# Altium footprint library SMotlaq-PCB_lib.PcbLib: 186 footprints (part 6 of 12)
Each footprint in its own frame and in the unit in brackets; x right, y up, seen from the top. Pads: shape width x height; smd on the part's side, far side on the other; paste and mask are expansions set on the pad; w line width, h text height; cw(c..) or ccw(c..) is an arc to the next point about the centre after c.
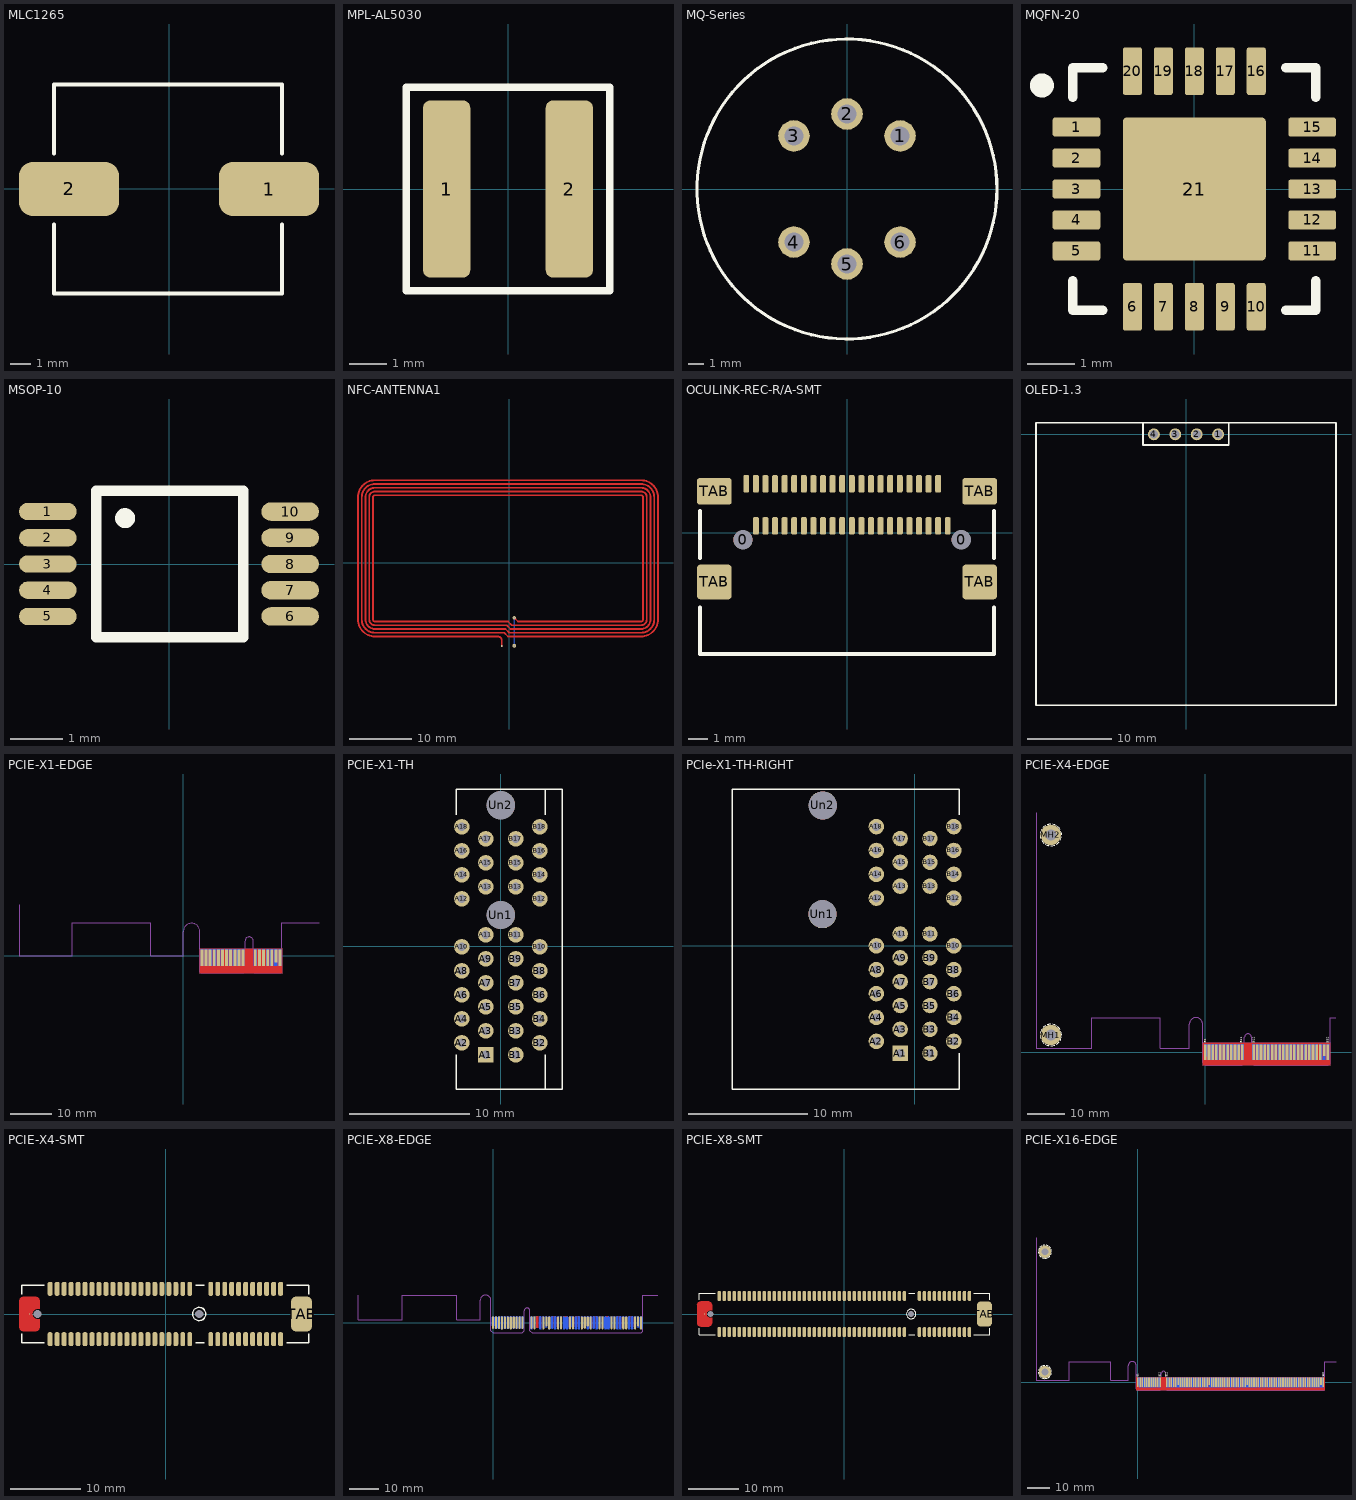
[diagram p5: the footprints below, top view; thin cyan lines are the x and y axes]

## MLC1265 [mm]
pads (2):
  rrect50% 5x2.7 smd mask+0.1: 1(5,0) 2(-5,0)
Top Overlay:
  lines w0.2: -5.75,-1.775 -5.75,-5.225 5.65,-5.225 5.65,-1.775 ; -5.75,1.775 -5.75,5.225 5.65,5.225 5.65,1.775
3D body "Coilcraft-MLC1265.step": height 6.4, standoff -0.01, extent -5.75,-5.275 5.65,5.225

## MPL-AL5030 [mm]
height 2.9
pads (2):
  rrect30% 1.25x4.7 smd mask+0.1: 1(-1.625,0) 2(1.625,0)
Top Overlay:
  lines w0.2: -2.7,-2.7 2.7,-2.7 2.7,2.7 -2.7,2.7 -2.7,-2.7
3D body "MPL-AL5030-1R5.stp": height 2.1, standoff 0, extent -2.65,-2.75 2.65,2.75

## MQ-Series [mm]
pads (6):
  round 2 hole 1.2: 1(3.359,3.359) 2(0,4.75) 3(-3.359,3.359) 4(-3.359,-3.359) 5(0,-4.75) 6(3.359,-3.359)
Top Overlay:
  circle w0.2: c0,0 r9.5
3D body "User Library-MQ-5.step": height 17.06, standoff -6, extent -9.5,-9.5 9.5,9.5

## MQFN-20 [mm]
pads (21):
  rrect25% 1x0.4 smd: 1(-2.475,1.3) 2(-2.475,0.65) 3(-2.475,0) 4(-2.475,-0.65) 5(-2.475,-1.3) 11(2.475,-1.3) 12(2.475,-0.65) 13(2.475,0) 14(2.475,0.65) 15(2.475,1.3)
  rrect25% 0.4x1 smd: 6(-1.3,-2.475) 7(-0.65,-2.475) 8(0,-2.475) 9(0.65,-2.475) 10(1.3,-2.475) 16(1.3,2.475) 17(0.65,2.475) 18(0,2.475) 19(-0.65,2.475) 20(-1.3,2.475)
  rrect5% 3x3 smd: 21(0,0)
Top Overlay:
  circle w0.254: c-3.2,2.175 r0.125
  lines w0.2: -2.55,-1.925 -2.55,-2.55 -1.925,-2.55 ; -2.55,1.925 -2.55,2.55 -1.925,2.55 ; 1.925,-2.55 2.55,-2.55 2.55,-1.925 ; 1.925,2.55 2.55,2.55 2.55,1.925
3D body "MCP96RL00-E_MX.stp": height 1, standoff 0, extent -2.55,-2.55 2.55,2.55

## MSOP-10 [mm]
pads (10):
  rrect100% 1.1x0.33 smd: 1(-2.312,1) 2(-2.312,0.5) 3(-2.312,0) 4(-2.312,-0.5) 5(-2.312,-1)
  rrect100% 1.1x0.35 smd: 6(2.312,-1) 7(2.312,-0.5) 8(2.312,0) 9(2.312,0.5) 10(2.312,1)
Top Overlay:
  circle w0.2: c-0.837,0.875 r0.09
  lines w0.2: -1.388,-1.4 1.412,-1.4 1.412,1.4 -1.388,1.4 -1.388,-1.4
3D body "User Library-MSOP-10-2.STEP": height 1.25, standoff 0, extent -2.437,-1.5 2.463,1.5

## NFC-ANTENNA1 [mm]
pads (2):
  round 0.6 hole 0.3 mask+0.102: 1(0.817,-13.268)
  round 0.3 smd mask+0.102: 2(-1.183,-13.268)
via 0.817,-8.768 diameter 0.6 hole 0.3
Top Layer:
  lines w0.3: -21.483,-10.568 cw(c-21.483,-9.068) -22.983,-9.068 -22.983,10.532 cw(c-21.483,10.532) -21.483,12.032 ; -21.483,-10.568 -0.583,-10.568 0.017,-11.168 ; -1.183,-13.268 -1.183,-12.368 ccw(c-1.783,-12.368) -1.783,-11.768 -21.483,-11.768 cw(c-21.483,-9.068) -24.183,-9.068 -24.183,10.532 cw(c-21.483,10.532) -21.483,13.232 21.117,13.232 cw(c21.117,10.532) 23.817,10.532 23.817,-9.068 cw(c21.117,-9.068) 21.117,-11.768 -0.183,-11.768 -0.783,-11.168 ; -0.783,-11.168 -21.483,-11.168 cw(c-21.483,-9.068) -23.583,-9.068 -23.583,10.532 cw(c-21.483,10.532) -21.483,12.632 ; 0.017,-11.168 21.117,-11.168 ; 0.417,-9.968 -0.183,-9.368 -21.483,-9.368 cw(c-21.483,-9.068) -21.783,-9.068 -21.783,10.532 cw(c-21.483,10.532) -21.483,10.832 21.117,10.832 cw(c21.117,10.532) 21.417,10.532 21.417,-9.068 cw(c21.117,-9.068) 21.117,-9.368 1.417,-9.368 0.817,-8.768 ; 0.417,-9.968 21.117,-9.968 ; 21.117,-10.568 0.217,-10.568 -0.383,-9.968 -21.483,-9.968 cw(c-21.483,-9.068) -22.383,-9.068 -22.383,10.532 cw(c-21.483,10.532) -21.483,11.432 ; 21.117,-10.568 ccw(c21.117,-9.068) 22.617,-9.068 22.617,10.532 ccw(c21.117,10.532) 21.117,12.032 ; -21.483,11.432 -21.483,11.432 ; -21.483,11.432 -21.483,11.432 ; -21.483,11.432 21.117,11.432 ; -21.483,12.032 -21.483,12.032 ; -21.483,12.032 -21.483,12.032 ; -21.483,12.032 21.117,12.032 ; -21.483,12.632 -21.483,12.632 ; -21.483,12.632 -21.483,12.632 ; -21.483,12.632 21.117,12.632 ; 21.117,-11.168 ccw(c21.117,-9.068) 23.217,-9.068 23.217,10.532 ccw(c21.117,10.532) 21.117,12.632 ; 21.117,-11.168 21.117,-11.168 ; 21.117,-11.168 21.117,-11.168 ; 21.117,-9.968 ccw(c21.117,-9.068) 22.017,-9.068 22.017,10.532 ccw(c21.117,10.532) 21.117,11.432 ; 21.117,-9.968 21.117,-9.968 ; 21.117,-9.968 21.117,-9.968 ; 21.117,11.432 21.117,11.432 ; 21.117,11.432 21.117,11.432 ; 21.117,12.032 21.117,12.032 ; 21.117,12.032 21.117,12.032 ; 21.117,12.632 21.117,12.632 ; 21.117,12.632 21.117,12.632
Bottom Layer:
  lines w0.3: 0.817,-13.268 0.817,-8.768

## OCULINK-REC-R/A-SMT [mm]
pads (48):
  round 1 hole 1 unplated mask+0.1: 0(-5.42,-0.355) 0(5.95,-0.355)
  rrect50% 0.31x0.91 smd mask+0.1: A1(-4.75,0.365) A2(-4.25,0.365) A3(-3.75,0.365) A4(-3.25,0.365) A5(-2.75,0.365) A6(-2.25,0.365) A7(-1.75,0.365) A8(-1.25,0.365) A9(-0.75,0.365) A10(-0.25,0.365) A11(0.25,0.365) A12(0.75,0.365) A13(1.25,0.365) A14(1.75,0.365) A15(2.25,0.365) A16(2.75,0.365) A17(3.25,0.365) A18(3.75,0.365) A19(4.25,0.365) A20(4.75,0.365) A21(5.25,0.365) B1(-5.25,2.555) B2(-4.75,2.555) B3(-4.25,2.555) B4(-3.75,2.555) B5(-3.25,2.555) B6(-2.75,2.555) B7(-2.25,2.555) B8(-1.75,2.555) B9(-1.25,2.555) B10(-0.75,2.555) B11(-0.25,2.555) B12(0.25,2.555) B13(0.75,2.555) B14(1.25,2.555) B15(1.75,2.555) B16(2.25,2.555) B17(2.75,2.555) B18(3.25,2.555) B19(3.75,2.555) B20(4.25,2.555) B21(4.75,2.555)
  rrect20% 1.81x1.81 smd mask+0.1: TAB(-6.91,-2.555) TAB(6.91,-2.555)
  rrect20% 1.81x1.38 smd mask+0.1: TAB(-6.91,2.165) TAB(6.91,2.165)
Top Overlay:
  lines w0.2: -7.65,-3.885 -7.65,-6.31 7.65,-6.31 7.65,-3.885 ; -7.65,-1.31 -7.65,1.14 ; 7.65,-1.31 7.65,1.14
3D body "G14A421211112HR.stp": height 3.92, standoff -0.54, extent -7.65,-6.325 7.65,2.745

## OLED-1.3 [mm]
pads (4):
  round 1.4 / inner round 1.4 / far side oval 1.4x2.2 hole 1 mask+0.1: 1(3.81,0) 2(1.27,0) 3(-1.27,0) 4(-3.81,0)
Top Overlay:
  lines w0.2: -5.1,1.37 -5.1,-1.255 5.075,-1.255 5.075,1.395 ; -17.825,1.395 -5.525,1.395 17.825,1.395 17.825,-32.205 -2.45,-32.205 -17.825,-32.205 -17.825,1.395 ; -17.825,1.395 -17.825,1.395
3D body "User Library-OLED-1_3-128X64.step": height 14.8, standoff 3, extent -17.825,-32.2 17.825,1.4
3D body "PBD-2.stp": height 8.5, standoff -3.15, extent -5.08,-1.27 0,1.27
3D body "PBD-2.stp": height 8.5, standoff -3.15, extent 0,-1.27 5.08,1.27

## PCIE-X1-EDGE [mil]
pads (36):
  rect 27.6x157.5 smd far side paste-99999: A1(178.12,-17.32) A2(217.12,-17.32) A3(256.12,-17.32) A4(296.12,-17.32) A5(335.12,-17.32) A6(374.12,-17.32) A7(414.12,-17.32) A8(453.12,-17.32) A9(493.12,-17.32) A10(532.12,-17.32) A11(571.12,-17.32) A12(689.12,-17.32) A13(729.12,-17.32) A14(768.12,-17.32) A15(808.12,-17.32) A16(847.12,-17.32) A17(886.12,-17.32) A18(926.12,-17.32)
  rect 27.6x157.5 smd paste-99999: B1(178.12,-17.36) B2(217.12,-17.36) B3(256.12,-17.36) B4(296.12,-17.36) B5(335.12,-17.36) B6(374.12,-17.32) B7(414.12,-17.32) B8(453.12,-17.32) B9(493.12,-17.32) B10(532.12,-17.32) B11(571.12,-17.32) B12(689.12,-17.32) B13(729.12,-17.32) B14(768.12,-17.32) B15(808.12,-17.32) B16(847.12,-17.32) B18(926.12,-17.32)
  rect 27.56x126 smd paste-99999: B17(886.49,-1.56)
Top Layer:
  pour cut-out: 157.48,68.9 157.48,-166.34 946.85,-166.34 946.85,68.9
Bottom Layer:
  pour cut-out: 157.48,68.9 157.48,-166.34 946.85,-166.34 946.85,68.9
Top Solder:
  rectangle: 157.48,-166.34 946.85,67.91
Bottom Solder:
  rectangle: 157.48,-166.34 946.85,67.91
Mechanical 1:
  lines w10: -1574.56,488.18 -1573.78,0.48 ; -1572.19,0.01 -1062.64,0.01 ; -1062.65,1.76 -1062.65,314.63 -314.32,314.63 -314.32,-0.32 0.64,0.02 0.64,231.39 cw(c79.38,231.39) 158.12,231.39 158.12,-151.31 170.12,-163.31 579.12,-163.31 591.12,-151.31 591.12,141.69 ; 591.15,141.77 cw(c630.52,141.77) 669.89,141.77 ; 670.12,141.69 670.12,-151.31 682.12,-163.31 929.2,-163.31 943.12,-149.4 ; 943.3,-149.4 943.3,314.63 1299.55,314.63

## PCIE-X1-TH [mm]
pads (38):
  rect 1.3x1.3 hole 0.7 paste-2539.97: A1(-1.237,-9.029)
  round 1.3 hole 0.7 paste-2539.97: A2(-3.237,-8.029) A3(-1.237,-7.029) A4(-3.237,-6.029) A5(-1.237,-5.029) A6(-3.237,-4.029) A7(-1.237,-3.029) A8(-3.237,-2.029) A9(-1.237,-1.029) A10(-3.237,-0.029) A11(-1.237,0.971) A12(-3.237,3.971) A13(-1.237,4.971) A14(-3.237,5.971) A15(-1.237,6.971) A16(-3.237,7.971) A17(-1.237,8.971) A18(-3.237,9.971) B1(1.263,-9.029) B2(3.263,-8.029) B3(1.263,-7.029) B4(3.263,-6.029) B5(1.263,-5.029) B6(3.263,-4.029) B7(1.263,-3.029) B8(3.263,-2.029) B9(1.263,-1.029) B10(3.263,-0.029) B11(1.263,0.971) B12(3.263,3.971) B13(1.263,4.971) B14(3.263,5.971) B15(1.263,6.971) B16(3.263,7.971) B17(1.263,8.971) B18(3.263,9.971)
  round 2.35 hole 2.35 paste-2539.97: Un1(0.013,2.621) Un2(0.013,11.771)
Top Overlay:
  lines w0.12: -3.687,-9.029 -3.687,-11.879 5.113,-11.879 5.113,13.121 -3.687,13.121 -3.687,10.971 ; 3.713,-11.879 3.713,-9.029 ; 3.713,10.971 3.713,13.121
3D body "User Library-pcie36p-c.step": height 11, standoff -4.4, extent -3.675,-12.025 5.125,12.975

## PCIe-X1-TH-RIGHT [mm]
pads (38):
  rect 1.3x1.3 hole 0.7 paste-2539.97: A1(-1.237,-9.029)
  round 1.3 hole 0.7 paste-2539.97: A2(-3.237,-8.029) A3(-1.237,-7.029) A4(-3.237,-6.029) A5(-1.237,-5.029) A6(-3.237,-4.029) A7(-1.237,-3.029) A8(-3.237,-2.029) A9(-1.237,-1.029) A10(-3.237,-0.029) A11(-1.237,0.971) A12(-3.237,3.971) A13(-1.237,4.971) A14(-3.237,5.971) A15(-1.237,6.971) A16(-3.237,7.971) A17(-1.237,8.971) A18(-3.237,9.971) B1(1.263,-9.029) B2(3.263,-8.029) B3(1.263,-7.029) B4(3.263,-6.029) B5(1.263,-5.029) B6(3.263,-4.029) B7(1.263,-3.029) B8(3.263,-2.029) B9(1.263,-1.029) B10(3.263,-0.029) B11(1.263,0.971) B12(3.263,3.971) B13(1.263,4.971) B14(3.263,5.971) B15(1.263,6.971) B16(3.263,7.971) B17(1.263,8.971) B18(3.263,9.971)
  round 2.35 hole 2.35 paste-2539.97: Un1(-7.75,2.625) Un2(-7.725,11.75)
Top Overlay:
  lines w0.12: 3.7,13.121 -15.3,13.121 -15.3,-12.025 3.713,-12.025 3.713,-9.029 ; 3.713,10.971 3.713,13.121
3D body "User Library-PCIE-036-02-X-D-RA.STEP": height 9.45, standoff -4.4, extent -15.275,-12.025 3.575,12.975

## PCIE-X4-EDGE [mm] "PCIE, 4LANE, EDGE pcb connection"
height 0.7
pads (66):
  rect 0.7x3.2 smd far side paste-2539.97: A1(0,0.5)
  rect 0.7x4.2 smd far side paste-2539.97 mask+0.075: A2(1,0) A3(2,0) A4(3,0) A5(4,0) A6(5,0) A7(6,0) A8(7,0) A9(8,0) A10(9,0) A11(10,0) A12(13,0) A13(14,0) A14(15,0) A15(16,0) A16(17,0) A17(18,0) A18(19,0) A19(20,0) A20(21,0) A21(22,0) A22(23,0) A23(24,0) A24(25,0) A25(26,0) A26(27,0) A27(28,0) A28(29,0) A29(30,0) A30(31,0) A31(32,0) A32(33,0)
  rect 0.7x4.2 smd paste-2539.97 mask+0.075: B1(0,0) B2(1,0) B3(2,0) B4(3,0) B5(4,0) B6(5,0) B7(6,0) B8(7,0) B9(8,0) B10(9,0) B11(10,0) B12(13,0) B13(14,0) B14(15,0) B15(16,0) B16(17,0) B17(18,0) B18(19,0) B19(20,0) B20(21,0) B21(22,0) B22(23,0) B23(24,0) B24(25,0) B25(26,0) B26(27,0) B27(28,0) B28(29,0) B29(30,0) B30(31,0) B32(33,0)
  rect 0.7x3.2 smd paste-2539.97: B31(32,0.5)
  round 5.5 hole 3: MH1(-41.6,4.6) MH2(-41.6,58.5)
Top Layer:
  pour cut-out: -0.7,2.5 -0.7,-3.5 33.625,-3.5 33.625,2.5
Bottom Layer:
  pour cut-out: -0.7,2.5 -0.7,-3.5 33.625,-3.5 33.625,2.5
Top Overlay:
  lines w0.2: -44.5,4.6 ccw(c-41.6,4.6) -44.325,3.608 ; -44.5,58.5 ccw(c-41.6,58.5) -44.325,57.508 ; -44.456,5.104 cw(c-41.6,4.6) -44.111,6.05 ; -44.456,59.004 cw(c-41.6,58.5) -44.111,59.95 ; -44.111,3.15 ccw(c-41.6,4.6) -43.464,2.378 ; -44.111,57.05 ccw(c-41.6,58.5) -43.464,56.278 ; -43.822,6.464 cw(c-41.6,4.6) -43.05,7.111 ; -43.822,60.364 cw(c-41.6,58.5) -43.05,61.011 ; -43.05,2.089 ccw(c-41.6,4.6) -42.104,1.744 ; -43.05,55.988 ccw(c-41.6,58.5) -42.104,55.644 ; -42.592,7.325 cw(c-41.6,4.6) -41.6,7.5 ; -42.592,61.225 cw(c-41.6,58.5) -41.6,61.4 ; -41.6,1.7 ccw(c-41.6,4.6) -40.608,1.875 ; -41.6,55.6 ccw(c-41.6,58.5) -40.608,55.775 ; -41.096,7.456 cw(c-41.6,4.6) -40.15,7.111 ; -41.096,61.356 cw(c-41.6,58.5) -40.15,61.011 ; -40.15,2.089 ccw(c-41.6,4.6) -39.378,2.736 ; -40.15,55.988 ccw(c-41.6,58.5) -39.378,56.636 ; -39.736,6.822 cw(c-41.6,4.6) -39.089,6.05 ; -39.736,60.721 cw(c-41.6,58.5) -39.089,59.95 ; -39.089,3.15 ccw(c-41.6,4.6) -38.744,4.096 ; -39.089,57.05 ccw(c-41.6,58.5) -38.744,57.996 ; -38.875,5.592 cw(c-41.6,4.6) -38.7,4.6 ; -38.875,59.492 cw(c-41.6,58.5) -38.7,58.5
  text "B32" at 33.3,2.5 h0.6
  text "B12" at 13.3,2.5 h0.6
  text "B11" at 10,2.5 h0.6
  text "B1" at 0.2,2.5 h0.6
Bottom Overlay:
  text "A32" at 33.3,4 h0.6
  text "A12" at 13.3,4 h0.6
  text "A11" at 10.1,4 h0.6
  text "A1" at 0.2,4 h0.6
Top Solder:
  rectangle: -0.7,-3.5 33.625,2.475
Bottom Solder:
  rectangle: -0.7,-3.5 33.625,2.475
Mechanical 1:
  lines w0.1: -45.6,64.425 -45.6,1 -30.6,1 -30.6,9.3 -12.2,9.3 -12.2,1 -4.3,1 -4.3,7.5 cw(c-2.5,7.5) -0.7,7.5 -0.7,-2.8 0,-3.5 9.8,-3.5 10.55,-2.75 10.55,4 cw(c11.5,4) 12.45,4 12.45,-2.75 13.2,-3.5 33,-3.5 33.6,-2.9 33.6,9.3 35.2,9.3
3D body "User Library-Low Profile Bracket.step": height 20, standoff -3, extent -62.64,-16.4 -36.5,63.887

## PCIE-X4-SMT [mm]
pads (68):
  rrect80% 0.7x2 smd mask+0.075: A1(16.475,-3.6) A2(15.475,-3.6) A3(14.475,-3.6) A4(13.475,-3.6) A5(12.475,-3.6) A6(11.475,-3.6) A7(10.475,-3.6) A8(9.475,-3.6) A9(8.475,-3.6) A10(7.475,-3.6) A11(6.475,-3.6) A12(3.475,-3.6) A13(2.475,-3.6) A14(1.475,-3.6) A15(0.475,-3.6) A16(-0.525,-3.6) A17(-1.525,-3.6) A18(-2.525,-3.6) A19(-3.525,-3.6) A20(-4.525,-3.6) A21(-5.525,-3.6) A22(-6.525,-3.6) A23(-7.525,-3.6) A24(-8.525,-3.6) A25(-9.525,-3.6) A26(-10.525,-3.6) A27(-11.525,-3.6) A28(-12.525,-3.6) A29(-13.525,-3.6) A30(-14.525,-3.6) A31(-15.525,-3.6) A32(-16.525,-3.6) B1(16.475,3.6) B2(15.475,3.6) B3(14.475,3.6) B4(13.475,3.6) B5(12.475,3.6) B6(11.475,3.6) B7(10.475,3.6) B8(9.475,3.6) B9(8.475,3.6) B10(7.475,3.6) B11(6.475,3.6) B12(3.475,3.6) B13(2.475,3.6) B14(1.475,3.6) B15(0.475,3.6) B16(-0.525,3.6) B17(-1.525,3.6) B18(-2.525,3.6) B19(-3.525,3.6) B20(-4.525,3.6) B21(-5.525,3.6) B22(-6.525,3.6) B23(-7.525,3.6) B24(-8.525,3.6) B25(-9.525,3.6) B26(-10.525,3.6) B27(-11.525,3.6) B28(-12.525,3.6) B29(-13.525,3.6) B30(-14.525,3.6) B31(-15.525,3.6) B32(-16.525,3.6)
  rrect100% 0x0 hole 1.2 unplated mask+0.075: PIN(-18.325,0) PIN(4.825,0)
  round 0.025 smd mask+0.075: TAB(-19.475,0)
  rrect50% 3x5 smd mask+0.075: TAB(19.475,0)
Top Layer:
  region: -20.975,1.75 -20.975,-1.75 -20.975,-1.799 -20.962,-1.897 -20.937,-1.992 -20.899,-2.082 -20.85,-2.168 -20.79,-2.246 -20.721,-2.315 -20.643,-2.375 -20.558,-2.424 -20.467,-2.462 -20.372,-2.487 -20.274,-2.5 -20.225,-2.5 -18.725,-2.5 -18.676,-2.5 -18.578,-2.487 -18.484,-2.462 -18.393,-2.424 -18.308,-2.375 -18.23,-2.315 -18.16,-2.246 -18.1,-2.168 -18.051,-2.082 -18.013,-1.992 -17.988,-1.897 -17.975,-1.799 -17.975,-1.75 -17.975,-0.725 -18.375,-0.725 -18.419,-0.724 -18.507,-0.712 -18.592,-0.689 -18.674,-0.655 -18.75,-0.611 -18.82,-0.557 -18.883,-0.495 -18.936,-0.425 -18.981,-0.349 -19.014,-0.267 -19.037,-0.182 -19.049,-0.094 -19.05,-0.05 -19.05,0.025 -19.049,0.071 -19.037,0.162 -19.013,0.25 -18.978,0.335 -18.932,0.414 -18.876,0.487 -18.812,0.551 -18.739,0.607 -18.66,0.653 -18.575,0.688 -18.487,0.712 -18.396,0.723 -18.35,0.725 -17.975,0.725 -17.975,1.75 -17.975,1.799 -17.988,1.897 -18.013,1.992 -18.051,2.082 -18.1,2.168 -18.16,2.246 -18.23,2.315 -18.308,2.375 -18.393,2.424 -18.484,2.462 -18.578,2.487 -18.676,2.5 -18.725,2.5 -19.375,2.5 -20.225,2.5 -20.274,2.5 -20.372,2.487 -20.467,2.462 -20.558,2.424 -20.643,2.375 -20.721,2.315 -20.79,2.246 -20.85,2.168 -20.899,2.082 -20.937,1.992 -20.962,1.897 -20.975,1.799
Top Overlay:
  circle w0.2: c4.825,0 r0.941
  lines w0.2: -20.55,-2.85 -20.55,-4.1 -17.375,-4.1 ; -20.55,2.85 -20.55,4.1 -17.375,4.1 ; 4.325,-4.1 5.575,-4.1 ; 4.325,4.1 5.575,4.1 ; 17.325,-4.1 20.5,-4.1 20.5,-2.85 ; 17.325,4.1 20.5,4.1 20.5,2.85
3D body "10061913-xx1.x_t": height 11.1, standoff -0.9, extent -20.517,-4.093 20.483,5.107

## PCIE-X8-EDGE [mm] "PCIE, 8LANE, EDGE pcb connections"
pads (98):
  rrect100% 0.7x3.4 smd far side paste-2539.97: A1(0,0.4)
  rrect100% 0.7x4.2 smd far side paste-2539.97 mask+0.075: A2(1,0) A3(2,0) A5(4,0) A6(5,0) A7(6,0) A8(7,0) A9(8,0) A10(9,0) A11(10,0) A19(20,0) A32(33,0) A33(34,0)
  rrect100% 0.7x4.4 smd far side paste-2539.97 mask+0.075: A4(3,-0.1) A12(13,-0.1) A15(16,-0.1) A18(19,-0.1) A20(21,-0.1) A23(24,-0.1) A24(25,-0.1) A27(28,-0.1) A28(29,-0.1) A31(32,-0.1) A34(35,-0.1) A37(38,-0.1) A38(39,-0.1) A41(42,-0.1) A42(43,-0.1) A45(46,-0.1) A46(47,-0.1) A49(50,-0.1)
  round 0.025 smd far side paste-2539.97 mask+0.075: A13(14,0.15) A14(15,0.15) A16(17,0.15) A17(18,0.15) A21(22,0.15) A22(23,0.15) A25(26,0.15) A26(27,0.15) A29(30,0.15) A30(31,0.15) A35(36,0.15) A36(37,0.15) A39(40,0.15) A40(41,0.15) A43(44,0.15) A44(45,0.15) A47(48,0.15) A48(49,0.15)
  rrect100% 0.7x4.2 smd paste-2539.97 mask+0.075: B1(0,0) B2(1,0) B3(2,0) B5(4,0) B6(5,0) B8(7,0) B9(8,0) B10(9,0) B11(10,0) B12(13,0) B30(31,0)
  rrect100% 0.7x4.4 smd paste-2539.97 mask+0.075: B4(3,-0.1) B7(6,-0.1) B13(14,-0.1) B16(17,-0.1) B18(19,-0.1) B21(22,-0.1) B22(23,-0.1) B25(26,-0.1) B26(27,-0.1) B29(30,-0.1) B32(33,-0.1) B35(36,-0.1) B36(37,-0.1) B39(40,-0.1) B40(41,-0.1) B43(44,-0.1) B44(45,-0.1) B47(48,-0.1) B49(50,-0.1)
  round 0.025 smd paste-2539.97 mask+0.075: B14(15,0.15) B15(16,0.15) B19(20,0.15) B20(21,0.15) B23(24,0.15) B24(25,0.15) B27(28,0.15) B28(29,0.15) B33(34,0.15) B34(35,0.15) B37(38,0.15) B38(39,0.15) B41(42,0.15) B42(43,0.15) B45(46,0.15) B46(47,0.15)
  rrect100% 0.7x3.4 smd paste-2539.97: B17(18,0.4) B31(32,0.4) B48(49,0.4)
Top Layer:
  region: 19.65,-1.45 19.65,-1.484 19.663,-1.552 19.69,-1.616 19.728,-1.673 19.777,-1.722 19.834,-1.76 19.898,-1.787 19.966,-1.8 20,-1.8 20.034,-1.8 20.102,-1.787 20.166,-1.76 20.223,-1.722 20.272,-1.673 20.31,-1.616 20.337,-1.552 20.35,-1.484 20.35,-1.45 20.35,2.1 20,2.1 19.966,2.1 19.898,2.087 19.834,2.06 19.777,2.022 19.728,1.973 19.69,1.916 19.663,1.852 19.65,1.784 19.65,1.75
  region: 23.65,-1.45 23.65,-1.484 23.663,-1.552 23.69,-1.616 23.728,-1.673 23.777,-1.722 23.834,-1.76 23.898,-1.787 23.966,-1.8 24,-1.8 24.034,-1.8 24.102,-1.787 24.166,-1.76 24.223,-1.722 24.272,-1.673 24.31,-1.616 24.337,-1.552 24.35,-1.484 24.35,-1.45 24.35,2.1 24,2.1 23.966,2.1 23.898,2.087 23.834,2.06 23.777,2.022 23.728,1.973 23.69,1.916 23.663,1.852 23.65,1.784 23.65,1.75
  region: 24.65,-1.45 24.65,-1.484 24.663,-1.552 24.69,-1.616 24.728,-1.673 24.777,-1.722 24.834,-1.76 24.898,-1.787 24.966,-1.8 25,-1.8 25.034,-1.8 25.102,-1.787 25.166,-1.76 25.223,-1.722 25.272,-1.673 25.31,-1.616 25.337,-1.552 25.35,-1.484 25.35,-1.45 25.35,1.75 25.35,1.784 25.337,1.852 25.31,1.916 25.272,1.973 25.223,2.022 25.166,2.06 25.102,2.087 25.034,2.1 25,2.1 24.65,2.1
  region: 20.65,-1.45 20.65,-1.484 20.664,-1.552 20.69,-1.616 20.728,-1.673 20.777,-1.722 20.834,-1.76 20.898,-1.787 20.966,-1.8 21,-1.8 21.035,-1.8 21.102,-1.787 21.166,-1.76 21.223,-1.722 21.272,-1.673 21.31,-1.616 21.337,-1.552 21.35,-1.484 21.35,-1.45 21.35,1.75 21.35,1.784 21.337,1.852 21.31,1.916 21.272,1.973 21.223,2.022 21.166,2.06 21.102,2.087 21.035,2.1 21,2.1 20.65,2.1
  region: 27.65,-1.45 27.65,-1.484 27.663,-1.552 27.69,-1.616 27.728,-1.673 27.777,-1.722 27.834,-1.76 27.898,-1.787 27.966,-1.8 28,-1.8 28.034,-1.8 28.102,-1.787 28.166,-1.76 28.223,-1.722 28.272,-1.673 28.31,-1.616 28.337,-1.552 28.35,-1.484 28.35,-1.45 28.35,2.1 28,2.1 27.966,2.1 27.898,2.087 27.834,2.06 27.777,2.022 27.728,1.973 27.69,1.916 27.663,1.852 27.65,1.784 27.65,1.75
  region: 45.65,-1.45 45.65,-1.484 45.663,-1.552 45.69,-1.616 45.728,-1.673 45.777,-1.722 45.834,-1.76 45.898,-1.787 45.966,-1.8 46,-1.8 46.034,-1.8 46.102,-1.787 46.166,-1.76 46.223,-1.722 46.272,-1.673 46.31,-1.616 46.337,-1.552 46.35,-1.484 46.35,-1.45 46.35,2.1 46,2.1 45.966,2.1 45.898,2.087 45.834,2.06 45.777,2.022 45.728,1.973 45.69,1.916 45.663,1.852 45.65,1.784 45.65,1.75
  region: 42.65,-1.45 42.65,-1.484 42.663,-1.552 42.69,-1.616 42.728,-1.673 42.777,-1.722 42.834,-1.76 42.898,-1.787 42.966,-1.8 43,-1.8 43.034,-1.8 43.102,-1.787 43.166,-1.76 43.223,-1.722 43.272,-1.673 43.31,-1.616 43.337,-1.552 43.35,-1.484 43.35,-1.45 43.35,1.75 43.35,1.784 43.337,1.852 43.31,1.916 43.272,1.973 43.223,2.022 43.166,2.06 43.102,2.087 43.034,2.1 43,2.1 42.65,2.1
  region: 37.65,-1.45 37.65,-1.484 37.663,-1.552 37.69,-1.616 37.728,-1.673 37.777,-1.722 37.834,-1.76 37.898,-1.787 37.966,-1.8 38,-1.8 38.034,-1.8 38.102,-1.787 38.166,-1.76 38.223,-1.722 38.272,-1.673 38.31,-1.616 38.337,-1.552 38.35,-1.484 38.35,-1.45 38.35,2.1 38,2.1 37.966,2.1 37.898,2.087 37.834,2.06 37.777,2.022 37.728,1.973 37.69,1.916 37.663,1.852 37.65,1.784 37.65,1.75
  region: 34.65,-1.45 34.65,-1.484 34.663,-1.552 34.69,-1.616 34.728,-1.673 34.777,-1.722 34.834,-1.76 34.898,-1.787 34.966,-1.8 35,-1.8 35.035,-1.8 35.102,-1.787 35.166,-1.76 35.223,-1.722 35.272,-1.673 35.31,-1.616 35.337,-1.552 35.35,-1.484 35.35,-1.45 35.35,1.75 35.35,1.784 35.337,1.852 35.31,1.916 35.272,1.973 35.223,2.022 35.166,2.06 35.102,2.087 35.035,2.1 35,2.1 34.65,2.1
  region: 33.65,-1.45 33.65,-1.484 33.663,-1.552 33.69,-1.616 33.728,-1.673 33.777,-1.722 33.834,-1.76 33.898,-1.787 33.966,-1.8 34,-1.8 34.035,-1.8 34.102,-1.787 34.166,-1.76 34.223,-1.722 34.272,-1.673 34.31,-1.616 34.337,-1.552 34.35,-1.484 34.35,-1.45 34.35,2.1 34,2.1 33.966,2.1 33.898,2.087 33.834,2.06 33.777,2.022 33.728,1.973 33.69,1.916 33.663,1.852 33.65,1.784 33.65,1.75
  region: 38.65,-1.45 38.65,-1.484 38.663,-1.552 38.69,-1.616 38.728,-1.673 38.777,-1.722 38.834,-1.76 38.898,-1.787 38.966,-1.8 39,-1.8 39.034,-1.8 39.102,-1.787 39.166,-1.76 39.223,-1.722 39.272,-1.673 39.31,-1.616 39.337,-1.552 39.35,-1.484 39.35,-1.45 39.35,1.75 39.35,1.784 39.337,1.852 39.31,1.916 39.272,1.973 39.223,2.022 39.166,2.06 39.102,2.087 39.034,2.1 39,2.1 38.65,2.1
  region: 41.65,-1.45 41.65,-1.484 41.663,-1.552 41.69,-1.616 41.728,-1.673 41.777,-1.722 41.834,-1.76 41.898,-1.787 41.966,-1.8 42,-1.8 42.034,-1.8 42.102,-1.787 42.166,-1.76 42.223,-1.722 42.272,-1.673 42.31,-1.616 42.337,-1.552 42.35,-1.484 42.35,-1.45 42.35,2.1 42,2.1 41.966,2.1 41.898,2.087 41.834,2.06 41.777,2.022 41.728,1.973 41.69,1.916 41.663,1.852 41.65,1.784 41.65,1.75
  region: 14.65,-1.45 14.65,-1.484 14.663,-1.552 14.69,-1.616 14.728,-1.673 14.777,-1.722 14.834,-1.76 14.898,-1.787 14.966,-1.8 15,-1.8 15.034,-1.8 15.102,-1.787 15.166,-1.76 15.223,-1.722 15.272,-1.673 15.31,-1.616 15.337,-1.552 15.35,-1.484 15.35,-1.45 15.35,2.1 15,2.1 14.966,2.1 14.898,2.087 14.834,2.06 14.777,2.022 14.728,1.973 14.69,1.916 14.663,1.852 14.65,1.784 14.65,1.75
  region: 15.65,-1.45 15.65,-1.484 15.663,-1.552 15.69,-1.616 15.728,-1.673 15.777,-1.722 15.834,-1.76 15.898,-1.787 15.966,-1.8 16,-1.8 16.034,-1.8 16.102,-1.787 16.166,-1.76 16.223,-1.722 16.272,-1.673 16.31,-1.616 16.337,-1.552 16.35,-1.484 16.35,-1.45 16.35,1.75 16.35,1.784 16.337,1.852 16.31,1.916 16.272,1.973 16.223,2.022 16.166,2.06 16.102,2.087 16.034,2.1 16,2.1 15.65,2.1
  region: 28.65,-1.45 28.65,-1.484 28.663,-1.552 28.69,-1.616 28.728,-1.673 28.777,-1.722 28.834,-1.76 28.898,-1.787 28.966,-1.8 29,-1.8 29.034,-1.8 29.102,-1.787 29.166,-1.76 29.223,-1.722 29.272,-1.673 29.31,-1.616 29.337,-1.552 29.35,-1.484 29.35,-1.45 29.35,1.75 29.35,1.784 29.337,1.852 29.31,1.916 29.272,1.973 29.223,2.022 29.166,2.06 29.102,2.087 29.034,2.1 29,2.1 28.65,2.1
  region: 46.65,-1.45 46.65,-1.484 46.663,-1.552 46.69,-1.616 46.728,-1.673 46.777,-1.722 46.834,-1.76 46.898,-1.787 46.966,-1.8 47,-1.8 47.034,-1.8 47.102,-1.787 47.166,-1.76 47.223,-1.722 47.272,-1.673 47.31,-1.616 47.337,-1.552 47.35,-1.484 47.35,-1.45 47.35,1.75 47.35,1.784 47.337,1.852 47.31,1.916 47.272,1.973 47.223,2.022 47.166,2.06 47.102,2.087 47.034,2.1 47,2.1 46.65,2.1
Bottom Layer:
  region: 29.65,-1.45 29.65,-1.484 29.663,-1.552 29.69,-1.616 29.728,-1.673 29.777,-1.722 29.834,-1.76 29.898,-1.787 29.966,-1.8 30,-1.8 30.034,-1.8 30.102,-1.787 30.166,-1.76 30.223,-1.722 30.272,-1.673 30.31,-1.616 30.337,-1.552 30.35,-1.484 30.35,-1.45 30.35,2.1 30,2.1 29.966,2.1 29.898,2.087 29.834,2.06 29.777,2.022 29.728,1.973 29.69,1.916 29.663,1.852 29.65,1.784 29.65,1.75
  region: 30.65,-1.45 30.65,-1.484 30.663,-1.552 30.69,-1.616 30.728,-1.673 30.777,-1.722 30.834,-1.76 30.898,-1.787 30.966,-1.8 31,-1.8 31.035,-1.8 31.102,-1.787 31.166,-1.76 31.223,-1.722 31.272,-1.673 31.31,-1.616 31.337,-1.552 31.35,-1.484 31.35,-1.45 31.35,1.75 31.35,1.784 31.337,1.852 31.31,1.916 31.272,1.973 31.223,2.022 31.166,2.06 31.102,2.087 31.035,2.1 31,2.1 30.65,2.1
  region: 43.65,-1.45 43.65,-1.484 43.663,-1.552 43.69,-1.616 43.728,-1.673 43.777,-1.722 43.834,-1.76 43.898,-1.787 43.966,-1.8 44,-1.8 44.034,-1.8 44.102,-1.787 44.166,-1.76 44.223,-1.722 44.272,-1.673 44.31,-1.616 44.337,-1.552 44.35,-1.484 44.35,-1.45 44.35,2.1 44,2.1 43.966,2.1 43.898,2.087 43.834,2.06 43.777,2.022 43.728,1.973 43.69,1.916 43.663,1.852 43.65,1.784 43.65,1.75
  region: 36.65,-1.45 36.65,-1.484 36.663,-1.552 36.69,-1.616 36.728,-1.673 36.777,-1.722 36.834,-1.76 36.898,-1.787 36.966,-1.8 37,-1.8 37.034,-1.8 37.102,-1.787 37.166,-1.76 37.223,-1.722 37.272,-1.673 37.31,-1.616 37.337,-1.552 37.35,-1.484 37.35,-1.45 37.35,1.75 37.35,1.784 37.337,1.852 37.31,1.916 37.272,1.973 37.223,2.022 37.166,2.06 37.102,2.087 37.034,2.1 37,2.1 36.65,2.1
  region: 44.65,-1.45 44.65,-1.484 44.663,-1.552 44.69,-1.616 44.728,-1.673 44.777,-1.722 44.834,-1.76 44.898,-1.787 44.966,-1.8 45,-1.8 45.034,-1.8 45.102,-1.787 45.166,-1.76 45.223,-1.722 45.272,-1.673 45.31,-1.616 45.337,-1.552 45.35,-1.484 45.35,-1.45 45.35,1.75 45.35,1.784 45.337,1.852 45.31,1.916 45.272,1.973 45.223,2.022 45.166,2.06 45.102,2.087 45.034,2.1 45,2.1 44.65,2.1
  region: 40.65,-1.45 40.65,-1.484 40.663,-1.552 40.69,-1.616 40.728,-1.673 40.777,-1.722 40.834,-1.76 40.898,-1.787 40.966,-1.8 41,-1.8 41.034,-1.8 41.102,-1.787 41.166,-1.76 41.223,-1.722 41.272,-1.673 41.31,-1.616 41.337,-1.552 41.35,-1.484 41.35,-1.45 41.35,1.75 41.35,1.784 41.337,1.852 41.31,1.916 41.272,1.973 41.223,2.022 41.166,2.06 41.102,2.087 41.034,2.1 41,2.1 40.65,2.1
  region: 39.65,-1.45 39.65,-1.484 39.663,-1.552 39.69,-1.616 39.728,-1.673 39.777,-1.722 39.834,-1.76 39.898,-1.787 39.966,-1.8 40,-1.8 40.034,-1.8 40.102,-1.787 40.166,-1.76 40.223,-1.722 40.272,-1.673 40.31,-1.616 40.337,-1.552 40.35,-1.484 40.35,-1.45 40.35,2.1 40,2.1 39.966,2.1 39.898,2.087 39.834,2.06 39.777,2.022 39.728,1.973 39.69,1.916 39.663,1.852 39.65,1.784 39.65,1.75
  region: 13.65,-1.45 13.65,-1.484 13.663,-1.552 13.69,-1.616 13.728,-1.673 13.777,-1.722 13.834,-1.76 13.898,-1.787 13.966,-1.8 14,-1.8 14.034,-1.8 14.102,-1.787 14.166,-1.76 14.223,-1.722 14.272,-1.673 14.31,-1.616 14.337,-1.552 14.35,-1.484 14.35,-1.45 14.35,2.1 14,2.1 13.966,2.1 13.898,2.087 13.834,2.06 13.777,2.022 13.728,1.973 13.69,1.916 13.663,1.852 13.65,1.784 13.65,1.75
  region: 14.65,-1.45 14.65,-1.484 14.663,-1.552 14.69,-1.616 14.728,-1.673 14.777,-1.722 14.834,-1.76 14.898,-1.787 14.966,-1.8 15,-1.8 15.034,-1.8 15.102,-1.787 15.166,-1.76 15.223,-1.722 15.272,-1.673 15.31,-1.616 15.337,-1.552 15.35,-1.484 15.35,-1.45 15.35,1.75 15.35,1.784 15.337,1.852 15.31,1.916 15.272,1.973 15.223,2.022 15.166,2.06 15.102,2.087 15.034,2.1 15,2.1 14.65,2.1
  region: 22.65,-1.45 22.65,-1.484 22.664,-1.552 22.69,-1.616 22.728,-1.673 22.777,-1.722 22.834,-1.76 22.898,-1.787 22.966,-1.8 23,-1.8 23.035,-1.8 23.102,-1.787 23.166,-1.76 23.223,-1.722 23.272,-1.673 23.31,-1.616 23.337,-1.552 23.35,-1.484 23.35,-1.45 23.35,1.75 23.35,1.784 23.337,1.852 23.31,1.916 23.272,1.973 23.223,2.022 23.166,2.06 23.102,2.087 23.035,2.1 23,2.1 22.65,2.1
  region: 21.65,-1.45 21.65,-1.484 21.664,-1.552 21.69,-1.616 21.728,-1.673 21.777,-1.722 21.834,-1.76 21.898,-1.787 21.966,-1.8 22,-1.8 22.035,-1.8 22.102,-1.787 22.166,-1.76 22.223,-1.722 22.272,-1.673 22.31,-1.616 22.337,-1.552 22.35,-1.484 22.35,-1.45 22.35,2.1 22,2.1 21.966,2.1 21.898,2.087 21.834,2.06 21.777,2.022 21.728,1.973 21.69,1.916 21.664,1.852 21.65,1.784 21.65,1.75
  region: 17.65,-1.45 17.65,-1.484 17.663,-1.552 17.69,-1.616 17.728,-1.673 17.777,-1.722 17.834,-1.76 17.898,-1.787 17.966,-1.8 18,-1.8 18.034,-1.8 18.102,-1.787 18.166,-1.76 18.223,-1.722 18.272,-1.673 18.31,-1.616 18.337,-1.552 18.35,-1.484 18.35,-1.45 18.35,1.75 18.35,1.784 18.337,1.852 18.31,1.916 18.272,1.973 18.223,2.022 18.166,2.06 18.102,2.087 18.034,2.1 18,2.1 17.65,2.1
  region: 35.65,-1.45 35.65,-1.484 35.663,-1.552 35.69,-1.616 35.728,-1.673 35.777,-1.722 35.834,-1.76 35.898,-1.787 35.966,-1.8 36,-1.8 36.034,-1.8 36.102,-1.787 36.166,-1.76 36.223,-1.722 36.272,-1.673 36.31,-1.616 36.337,-1.552 36.35,-1.484 36.35,-1.45 36.35,2.1 36,2.1 35.966,2.1 35.898,2.087 35.834,2.06 35.777,2.022 35.728,1.973 35.69,1.916 35.663,1.852 35.65,1.784 35.65,1.75
  region: 47.65,-1.45 47.65,-1.484 47.663,-1.552 47.69,-1.616 47.728,-1.673 47.777,-1.722 47.834,-1.76 47.898,-1.787 47.966,-1.8 48,-1.8 48.034,-1.8 48.102,-1.787 48.166,-1.76 48.223,-1.722 48.272,-1.673 48.31,-1.616 48.337,-1.552 48.35,-1.484 48.35,-1.45 48.35,2.1 48,2.1 47.966,2.1 47.898,2.087 47.834,2.06 47.777,2.022 47.728,1.973 47.69,1.916 47.663,1.852 47.65,1.784 47.65,1.75
  region: 25.65,-1.45 25.65,-1.484 25.663,-1.552 25.69,-1.616 25.728,-1.673 25.777,-1.722 25.834,-1.76 25.898,-1.787 25.966,-1.8 26,-1.8 26.034,-1.8 26.102,-1.787 26.166,-1.76 26.223,-1.722 26.272,-1.673 26.31,-1.616 26.337,-1.552 26.35,-1.484 26.35,-1.45 26.35,2.1 26,2.1 25.966,2.1 25.898,2.087 25.834,2.06 25.777,2.022 25.728,1.973 25.69,1.916 25.663,1.852 25.65,1.784 25.65,1.75
  region: 26.65,-1.45 26.65,-1.484 26.663,-1.552 26.69,-1.616 26.728,-1.673 26.777,-1.722 26.834,-1.76 26.898,-1.787 26.966,-1.8 27,-1.8 27.034,-1.8 27.102,-1.787 27.166,-1.76 27.223,-1.722 27.272,-1.673 27.31,-1.616 27.337,-1.552 27.35,-1.484 27.35,-1.45 27.35,1.75 27.35,1.784 27.337,1.852 27.31,1.916 27.272,1.973 27.223,2.022 27.166,2.06 27.102,2.087 27.034,2.1 27,2.1 26.65,2.1
  region: 48.65,-1.45 48.65,-1.484 48.663,-1.552 48.69,-1.616 48.728,-1.673 48.777,-1.722 48.834,-1.76 48.898,-1.787 48.966,-1.8 49,-1.8 49.034,-1.8 49.102,-1.787 49.166,-1.76 49.223,-1.722 49.272,-1.673 49.31,-1.616 49.337,-1.552 49.35,-1.484 49.35,-1.45 49.35,1.75 49.35,1.784 49.337,1.852 49.31,1.916 49.272,1.973 49.223,2.022 49.166,2.06 49.102,2.087 49.034,2.1 49,2.1 48.65,2.1
  region: 16.65,-1.45 16.65,-1.484 16.663,-1.552 16.69,-1.616 16.728,-1.673 16.777,-1.722 16.834,-1.76 16.898,-1.787 16.966,-1.8 17,-1.8 17.034,-1.8 17.102,-1.787 17.166,-1.76 17.223,-1.722 17.272,-1.673 17.31,-1.616 17.337,-1.552 17.35,-1.484 17.35,-1.45 17.35,2.1 17,2.1 16.966,2.1 16.898,2.087 16.834,2.06 16.777,2.022 16.728,1.973 16.69,1.916 16.663,1.852 16.65,1.784 16.65,1.75
Top Solder:
  region: 12.4,2.107 50.65,2.107 50.65,-3.025 50.175,-3.5 13.2,-3.5 12.4,-2.7
  region: -0.7,2.107 -0.7,-2.8 0,-3.5 9.8,-3.5 10.6,-2.7 10.6,2.107
Bottom Solder:
  region: 12.4,2.107 50.65,2.107 50.65,-3.025 50.175,-3.5 13.2,-3.5 12.4,-2.7
  region: -0.7,2.107 -0.7,-2.8 0,-3.5 9.8,-3.5 10.6,-2.7 10.6,2.107
Mechanical 1:
  lines w0.1: -45.6,9.3 -45.6,1 -30.6,1 -30.6,9.3 -12.2,9.3 -12.2,1 -4.3,1 -4.3,7.5 cw(c-2.5,7.5) -0.7,7.5 -0.7,-2.8 0,-3.5 9.8,-3.5 10.55,-2.75 10.55,4 cw(c11.5,4) 12.45,4 12.45,-2.75 13.2,-3.5 50.15,-3.5 50.65,-3 50.65,9.275 55.73,9.275
Multi-Layer:
  pour cut-out: -0.7,2.079 -0.7,-3.5 50.65,-3.5 50.65,2.079

## PCIE-X8-SMT [mm]
pads (102):
  rrect80% 0.7x2 smd mask+0.075: A1(24.975,-3.6) A2(23.975,-3.6) A3(22.975,-3.6) A4(21.975,-3.6) A5(20.975,-3.6) A6(19.975,-3.6) A7(18.975,-3.6) A8(17.975,-3.6) A9(16.975,-3.6) A10(15.975,-3.6) A11(14.975,-3.6) A12(11.975,-3.6) A13(10.975,-3.6) A14(9.975,-3.6) A15(8.975,-3.6) A16(7.975,-3.6) A17(6.975,-3.6) A18(5.975,-3.6) A19(4.975,-3.6) A20(3.975,-3.6) A21(2.975,-3.6) A22(1.975,-3.6) A23(0.975,-3.6) A24(-0.025,-3.6) A25(-1.025,-3.6) A26(-2.025,-3.6) A27(-3.025,-3.6) A28(-4.025,-3.6) A29(-5.025,-3.6) A30(-6.025,-3.6) A31(-7.025,-3.6) A32(-8.025,-3.6) A33(-9.025,-3.6) A34(-10.025,-3.6) A35(-11.025,-3.6) A36(-12.025,-3.6) A37(-13.025,-3.6) A38(-14.025,-3.6) A39(-15.025,-3.6) A40(-16.025,-3.6) A41(-17.025,-3.6) A42(-18.025,-3.6) A43(-19.025,-3.6) A44(-20.025,-3.6) A45(-21.025,-3.6) A46(-22.025,-3.6) A47(-23.025,-3.6) A48(-24.025,-3.6) A49(-25.025,-3.6) B1(24.975,3.6) B2(23.975,3.6) B3(22.975,3.6) B4(21.975,3.6) B5(20.975,3.6) B6(19.975,3.6) B7(18.975,3.6) B8(17.975,3.6) B9(16.975,3.6) B10(15.975,3.6) B11(14.975,3.6) B12(11.975,3.6) B13(10.975,3.6) B14(9.975,3.6) B15(8.975,3.6) B16(7.975,3.6) B17(6.975,3.6) B18(5.975,3.6) B19(4.975,3.6) B20(3.975,3.6) B21(2.975,3.6) B22(1.975,3.6) B23(0.975,3.6) B24(-0.025,3.6) B25(-1.025,3.6) B26(-2.025,3.6) B27(-3.025,3.6) B28(-4.025,3.6) B29(-5.025,3.6) B30(-6.025,3.6) B31(-7.025,3.6) B32(-8.025,3.6) B33(-9.025,3.6) B34(-10.025,3.6) B35(-11.025,3.6) B36(-12.025,3.6) B37(-13.025,3.6) B38(-14.025,3.6) B39(-15.025,3.6) B40(-16.025,3.6) B41(-17.025,3.6) B42(-18.025,3.6) B43(-19.025,3.6) B44(-20.025,3.6) B45(-21.025,3.6) B46(-22.025,3.6) B47(-23.025,3.6) B48(-24.025,3.6) B49(-25.025,3.6)
  rrect100% 0x0 hole 1.2 unplated mask+0.075: PIN(-26.825,0) PIN(13.325,0)
  round 0.025 smd mask+0.075: TAB(-27.975,0)
  rrect50% 3x5 smd mask+0.075: TAB(27.975,0)
Top Layer:
  region: -29.475,1.75 -29.475,-1.75 -29.475,-1.799 -29.462,-1.897 -29.437,-1.992 -29.399,-2.082 -29.35,-2.168 -29.29,-2.246 -29.221,-2.315 -29.143,-2.375 -29.057,-2.424 -28.967,-2.462 -28.872,-2.487 -28.774,-2.5 -28.725,-2.5 -27.225,-2.5 -27.176,-2.5 -27.078,-2.487 -26.983,-2.462 -26.893,-2.424 -26.808,-2.375 -26.73,-2.315 -26.66,-2.246 -26.6,-2.168 -26.551,-2.082 -26.513,-1.992 -26.488,-1.897 -26.475,-1.799 -26.475,-1.75 -26.475,-0.725 -26.875,-0.725 -26.919,-0.724 -27.007,-0.712 -27.092,-0.689 -27.174,-0.655 -27.25,-0.611 -27.32,-0.557 -27.383,-0.495 -27.436,-0.425 -27.48,-0.349 -27.514,-0.267 -27.537,-0.182 -27.549,-0.094 -27.55,-0.05 -27.55,0.025 -27.549,0.071 -27.537,0.162 -27.513,0.25 -27.478,0.335 -27.432,0.414 -27.376,0.487 -27.312,0.551 -27.239,0.607 -27.16,0.653 -27.075,0.688 -26.987,0.712 -26.896,0.723 -26.85,0.725 -26.475,0.725 -26.475,1.75 -26.475,1.799 -26.488,1.897 -26.513,1.992 -26.551,2.082 -26.6,2.168 -26.66,2.246 -26.729,2.315 -26.807,2.375 -26.893,2.424 -26.983,2.462 -27.078,2.487 -27.176,2.5 -27.225,2.5 -27.875,2.5 -28.725,2.5 -28.774,2.5 -28.872,2.487 -28.967,2.462 -29.058,2.424 -29.143,2.375 -29.221,2.315 -29.29,2.246 -29.35,2.168 -29.399,2.082 -29.437,1.992 -29.462,1.897 -29.475,1.799
Top Overlay:
  circle w0.2: c13.325,0 r0.941
  lines w0.2: -29.05,-2.85 -29.05,-4.1 -25.875,-4.1 ; -29.05,2.85 -29.05,4.1 -25.875,4.1 ; 12.825,-4.1 14.075,-4.1 ; 12.825,4.1 14.075,4.1 ; 25.825,-4.1 29,-4.1 29,-2.85 ; 25.825,4.1 29,4.1 29,2.85
3D body "10146070-112Y1LF.stp": height 12, standoff 0, extent -29.05,-4.1 28.95,5.1

## PCIE-X16-EDGE [mm] "PCIE, 16LANE, EDGE pcb connection"
pads (166):
  rect 0.7x3.4 smd far side paste-2539.97: A1(0,0.4)
  rect 0.7x4.2 smd far side paste-2539.97 mask+0.075: A2(1,0) A3(2,0) A4(3,0) A5(4,0) A6(5,0) A7(6,0) A8(7,0) A9(8,0) A10(9,0) A11(10,0) A12(13,0) A13(14,0) A14(15,0) A15(16,0) A16(17,0) A17(18,0) A18(19,0) A19(20,0) A20(21,0) A21(22,0) A22(23,0) A23(24,0) A24(25,0) A25(26,0) A26(27,0) A27(28,0) A28(29,0) A29(30,0) A30(31,0) A31(32,0) A32(33,0) A33(34,0) A34(35,0) A35(36,0) A36(37,0) A37(38,0) A38(39,0) A39(40,0) A40(41,0) A41(42,0) A42(43,0) A43(44,0) A44(45,0) A45(46,0) A46(47,0) A47(48,0) A48(49,0) A49(50,0) A50(51,0) A51(52,0) A52(53,0) A53(54,0) A54(55,0) A55(56,0) A56(57,0) A57(58,0) A58(59,0) A59(60,0) A60(61,0) A61(62,0) A62(63,0) A63(64,0) A64(65,0) A65(66,0) A66(67,0) A67(68,0) A68(69,0) A69(70,0) A70(71,0) A71(72,0) A72(73,0) A73(74,0) A74(75,0) A75(76,0) A76(77,0) A77(78,0) A78(79,0) A79(80,0) A80(81,0) A81(82,0) A82(83,0)
  rect 0.7x4.2 smd paste-2539.97 mask+0.075: B1(0,0) B2(1,0) B3(2,0) B4(3,0) B5(4,0) B6(5,0) B7(6,0) B8(7,0) B9(8,0) B10(9,0) B11(10,0) B12(13,0) B13(14,0) B14(15,0) B15(16,0) B16(17,0) B18(19,0) B19(20,0) B20(21,0) B21(22,0) B22(23,0) B23(24,0) B24(25,0) B25(26,0) B26(27,0) B27(28,0) B28(29,0) B29(30,0) B30(31,0) B32(33,0) B33(34,0) B34(35,0) B35(36,0) B36(37,0) B37(38,0) B38(39,0) B39(40,0) B40(41,0) B41(42,0) B42(43,0) B43(44,0) B44(45,0) B45(46,0) B46(47,0) B47(48,0) B49(50,0) B50(51,0) B51(52,0) B52(53,0) B53(54,0) B54(55,0) B55(56,0) B56(57,0) B57(58,0) B58(59,0) B59(60,0) B60(61,0) B61(62,0) B62(63,0) B63(64,0) B64(65,0) B65(66,0) B66(67,0) B67(68,0) B68(69,0) B69(70,0) B70(71,0) B71(72,0) B72(73,0) B73(74,0) B74(75,0) B75(76,0) B76(77,0) B77(78,0) B78(79,0) B79(80,0) B80(81,0) B82(83,0)
  rect 0.7x3.4 smd paste-2539.97: B17(18,0.4) B31(32,0.4) B48(49,0.4) B81(82,0.4)
  round 5.5 hole 3: MH1(-41.6,4.6) MH2(-41.6,58.5)
Top Layer:
  pour cut-out: -0.7,2.35 -0.7,-3.5 83.65,-3.5 83.65,2.35 -0.675,2.35
Bottom Layer:
  pour cut-out: -0.7,2.35 -0.7,-3.5 83.65,-3.5 83.65,2.35 -0.675,2.35
Top Overlay:
  lines w0.2: -44.5,4.6 ccw(c-41.6,4.6) -44.325,3.608 ; -44.5,58.5 ccw(c-41.6,58.5) -44.325,57.508 ; -44.456,5.104 cw(c-41.6,4.6) -44.111,6.05 ; -44.456,59.004 cw(c-41.6,58.5) -44.111,59.95 ; -44.111,3.15 ccw(c-41.6,4.6) -43.464,2.378 ; -44.111,57.05 ccw(c-41.6,58.5) -43.464,56.278 ; -43.822,6.464 cw(c-41.6,4.6) -43.05,7.111 ; -43.822,60.364 cw(c-41.6,58.5) -43.05,61.011 ; -43.05,2.089 ccw(c-41.6,4.6) -42.104,1.744 ; -43.05,55.988 ccw(c-41.6,58.5) -42.104,55.644 ; -42.592,7.325 cw(c-41.6,4.6) -41.6,7.5 ; -42.592,61.225 cw(c-41.6,58.5) -41.6,61.4 ; -41.6,1.7 ccw(c-41.6,4.6) -40.608,1.875 ; -41.6,55.6 ccw(c-41.6,58.5) -40.608,55.775 ; -41.096,7.456 cw(c-41.6,4.6) -40.15,7.111 ; -41.096,61.356 cw(c-41.6,58.5) -40.15,61.011 ; -40.15,2.089 ccw(c-41.6,4.6) -39.378,2.736 ; -40.15,55.988 ccw(c-41.6,58.5) -39.378,56.636 ; -39.736,6.822 cw(c-41.6,4.6) -39.089,6.05 ; -39.736,60.721 cw(c-41.6,58.5) -39.089,59.95 ; -39.089,3.15 ccw(c-41.6,4.6) -38.744,4.096 ; -39.089,57.05 ccw(c-41.6,58.5) -38.744,57.996 ; -38.875,5.592 cw(c-41.6,4.6) -38.7,4.6 ; -38.875,59.492 cw(c-41.6,58.5) -38.7,58.5
  text "B82" at 83.4,2.4 h0.8
  text "B11" at 10.3,2.4 h0.8
  text "B12" at 13.5,2.4 h0.8
  text "B1" at 0.5,2.5 h0.8
Bottom Overlay:
  text "A82" at 83.391,4.477 h0.8
  text "A12" at 13.561,4.339 h0.8
  text "A11" at 10.2,3.941 h0.8
  text "A1" at 0.536,3.585 h0.8
Top Solder:
  region: -0.7,2.3 -0.7,-2.8 0,-3.5 9.8,-3.5 10.6,-2.7 10.6,2.3
  region: 12.4,2.3 83.7,2.3 83.7,-2.9 83.1,-3.5 13.2,-3.5 12.4,-2.7
Bottom Solder:
  region: -0.7,2.3 -0.7,-2.8 0,-3.5 9.8,-3.5 10.6,-2.7 10.6,2.3
  region: 12.4,2.3 83.7,2.3 83.7,-2.9 83.1,-3.5 13.2,-3.5 12.4,-2.7
Mechanical 1:
  lines w0.1: -45.6,64.675 -45.6,1 -30.6,1 -30.6,9.3 -12.2,9.3 -12.2,1 -4.3,1 -4.3,7.5 cw(c-2.5,7.5) -0.7,7.5 -0.7,-2.8 0,-3.5 9.8,-3.5 10.55,-2.75 10.55,4 cw(c11.5,4) 12.45,4 12.45,-2.75 13.2,-3.5 83.15,-3.5 ; 83.15,-3.475 83.65,-2.975 83.65,9.275 88.73,9.275
3D body "User Library-Low Profile Bracket.step": height 20, standoff -3, extent -62.64,-16.4 -36.5,63.887